# Altium footprint library Ixora.PcbLib: 191 footprints (part 4 of 12)
Each footprint in its own frame and in the unit in brackets; x right, y up, seen from the top. Pads: shape width x height; smd on the part's side, far side on the other; paste and mask are expansions set on the pad; w line width, h text height; cw(c..) or ccw(c..) is an arc to the next point about the centre after c.
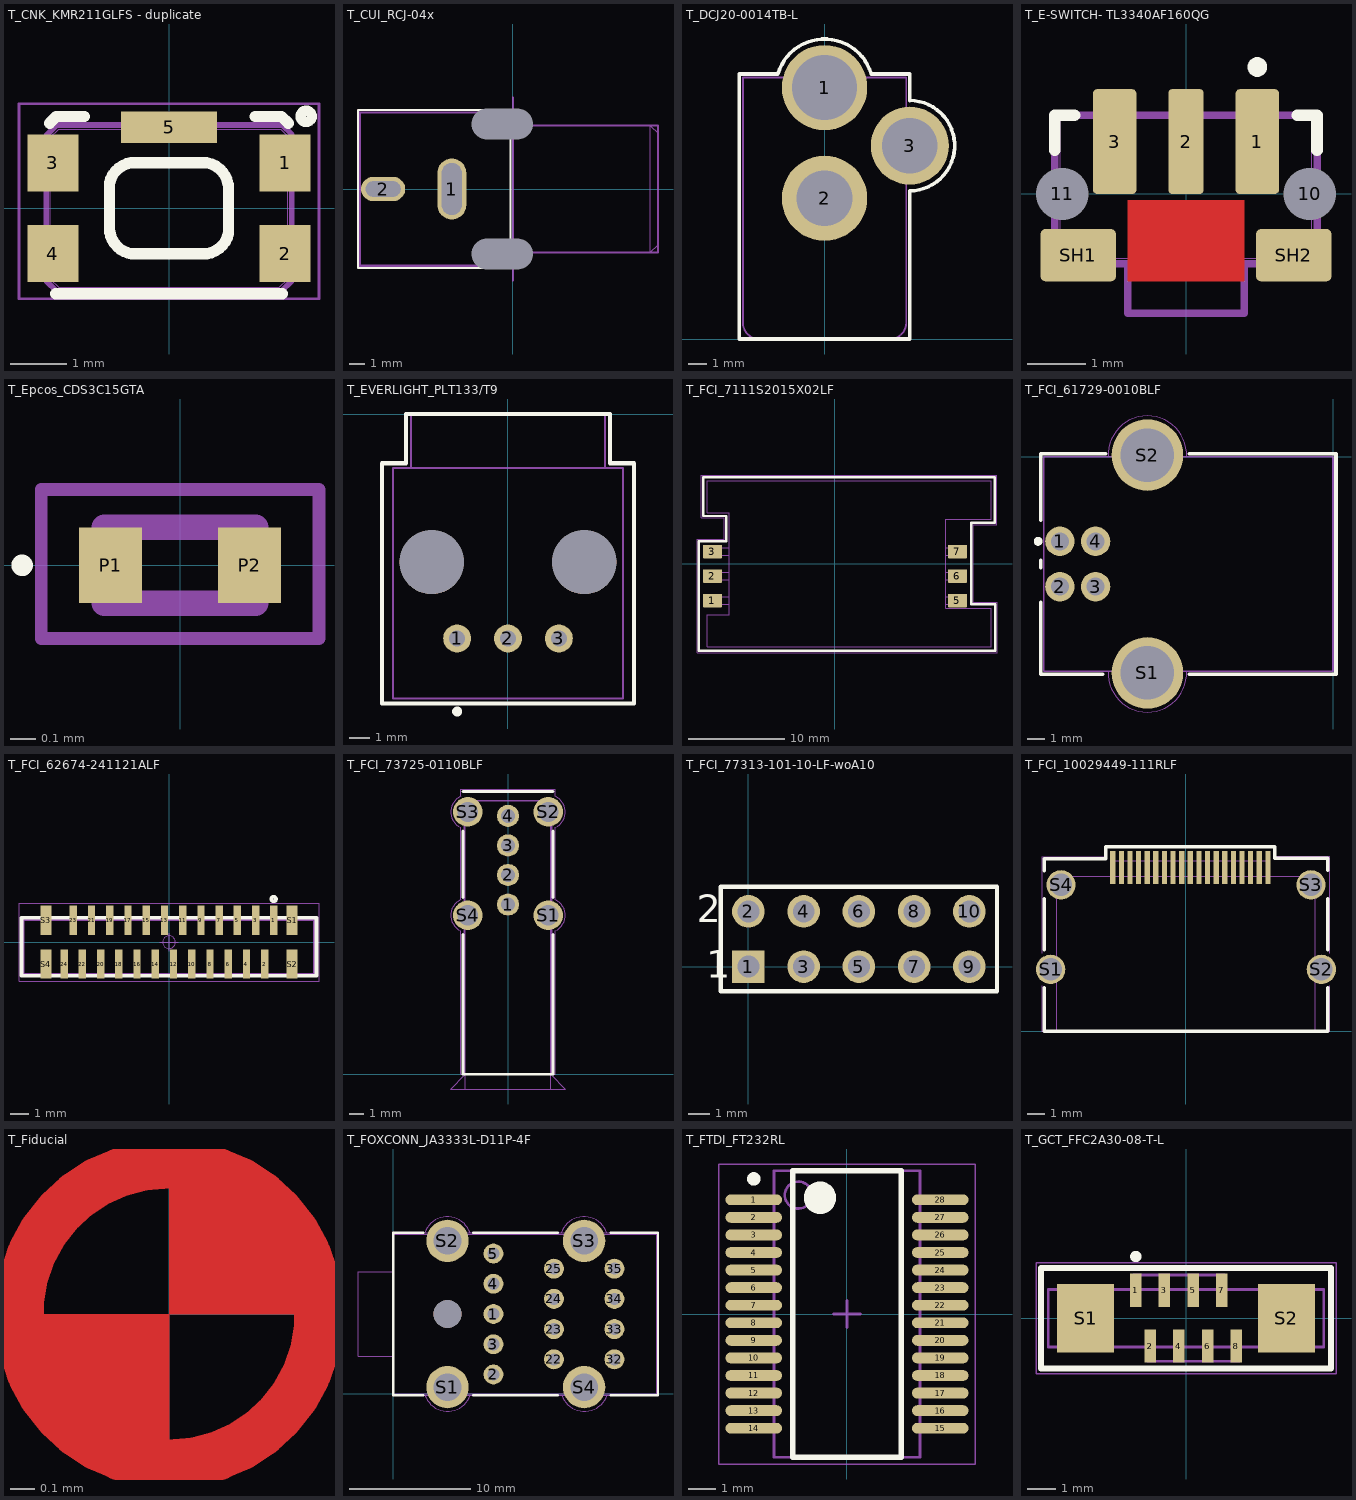
[diagram p3: the footprints below, top view; thin cyan lines are the x and y axes]

## T_CNK_KMR211GLFS - duplicate [mm] "Microminiature Tact Switch for SMT"
height 1.9
pads (5):
  rect 0.9x1 smd: 1(2.05,0.8) 2(2.05,-0.8) 3(-2.05,0.8) 4(-2.05,-0.8)
  rect 1.7x0.55 smd: 5(0,1.43)
Top Overlay:
  circle w0.18: c2.424,1.624 r0.1
  lines w0.2: -2.109,1.502 -1.991,1.62 -1.5,1.62 ; -2,-1.51 2,-1.51 ; -1.05,-0.36 -1.05,0.44 ; -1.05,-0.35 ccw(c-0.59,-0.35) -0.662,-0.804 ; -1.05,0.444 cw(c-0.6,0.35) -0.669,0.805 ; -0.66,0.805 0.66,0.805 ; -0.655,-0.805 0.65,-0.805 ; 0.669,-0.805 ccw(c0.6,-0.35) 1.05,-0.444 ; 0.684,0.8 cw(c0.59,0.35) 1.045,0.419 ; 1.05,-0.44 1.05,0.4 ; 1.52,1.621 1.989,1.621 2.108,1.502
Mechanical 1:
  lines w0.05: -2.65,-1.6 2.65,-1.6 2.65,1.845 -2.65,1.845 -2.65,-1.6
Mechanical 2:
  lines w0.001: -2.1,-1.25 -1.95,-1.4 1.95,-1.4 2.1,-1.25 2.1,1.27 1.97,1.4 -1.95,1.4 -2.1,1.25 -2.1,-1.25
Mechanical 3:
  lines w0.1: -2.17,-1.28 -1.98,-1.47 1.98,-1.47 2.17,-1.28 2.17,1.3 2,1.47 -1.98,1.47 -2.17,1.28 -2.17,-1.28
3D body: height 2.12, standoff 0.02, extent -2.299,-1.509 2.301,1.491

## T_CUI_RCJ-04x [mm] "Right Angle RCA Connector THT"
height 12.6
pads (4):
  oval 1.9x4 hole 1.3 slot 3.4 at 90 deg: 1(-4,0)
  oval 2.9x1.6 hole 1 slot 2.3 at 0 deg: 2(-8.5,0)
  round 0 hole 2 slot 4 at 0 deg: Hole1(-0.7,4.25) Hole2(-0.7,-4.25)
Top Overlay:
  lines w0.127: -0.147,5.165 -10.143,5.165 -10.143,-5.165 -0.146,-5.165 -0.146,5.144
Mechanical 1:
  lines w0.127: -10.123,-5.152 -10.123,5.185 0,5.185 0,-5.152 -10.123,-5.152
Mechanical 2:
  lines w0: 0,-5 0,5
  lines w0.001: 0,-5 -10,-5 -10,5 0,5 ; 0,-4.15 9,-4.15 ; 0,4.15 9,4.15 ; 9,-4.15 9,4.15 ; 9,-4.15 9.5,-3.65 9.5,3.65 9,4.15
Mechanical 3:
  lines w0.127: 0,-6 0,6 ; 0,-4.15 9.5,-4.15 9.5,4.15 0,4.15 ; -10,-5 -10,5 0,5 0,-5 -10,-5

## T_DCJ20-0014TB-L [mm] "Header, 1x2 Pins, 2.54 mm pitch, male"
height 10.7
pads (3):
  round 4.7 hole 3.58: 1(0,13.85)
  round 4.7 hole 3.07: 2(0,7.75)
  round 4.3 hole 3.07: 3(4.7,10.65)
Top Overlay:
  lines w0.2: -2.569,14.598 cw(c0,13.85) 2.569,14.6 4.7,14.6 4.7,13.142 cw(c4.675,10.65) 4.7,8.158 ; -2.569,14.6 -4.7,14.6 -4.7,0 4.675,0 ; 4.7,0 4.7,8.157
Mechanical 1:
  lines w0.05: 4.675,0 -4.7,0 -4.7,14.6 -2.568,14.6 cw(c0,13.85) 2.568,14.6 4.7,14.6 4.7,13.125 cw(c4.7,10.65) 4.7,8.175 4.7,0
Mechanical 2:
  lines w0.001: -1.4,13.95 -1.4,14.4 -4.5,14.4 -4.5,0.9 ccw(c-3.6,0.9) -3.6,0 3.6,0 ; 1.4,13.95 1.4,14.4 4.5,14.4 4.5,0.9 cw(c3.6,0.9) 3.6,0
Mechanical 3:
  lines w0.1: -4.5,0.9 ccw(c-3.6,0.9) -3.6,0 3.6,0 ccw(c3.6,0.9) 4.5,0.9 4.5,14.4 -4.5,14.4 -4.5,0.9
3D body: height 10.7, standoff 0, extent -4.5,0 4.5,14.4
3D body: height 4, standoff -3.7, extent 4.5,9.45 4.7,11.85
3D body: height 4, standoff -3.7, extent -1.2,7.65 1.2,7.85
3D body: height 4, standoff -3.7, extent -1.4,13.75 1.4,13.95
3D body: height 9.59, standoff 3.21, extent -3.2,0 3.175,2
3D body: height 7.4, standoff 5.4, extent -1,0 0.992,2

## T_E-SWITCH- TL3340AF160QG [mm] "SWITCH TACT SUB MINI 160GF SMD"
height 3.3
pads (7):
  rrect20% 0.75x1.8 smd: 1(1.225,0.9) 3(-1.225,0.9)
  rrect20% 0.6x1.8 smd: 2(0,0.9)
  round 0.5 hole 0.9: 10(2.125,0) 11(-2.125,0)
  rrect20% 1.3x0.9 smd: SH1(-1.85,-1.05) SH2(1.85,-1.05)
Top Layer:
  pour cut-out: -1,-0.103 -1,-1.5 1,-1.5 1,-0.103
Top Overlay:
  circle w0.254: c1.225,2.18 r0.041
  lines w0.2: -2.255,0.75 -2.255,1.35 -1.915,1.35 ; 1.91,1.35 2.25,1.35 2.25,0.75
Mechanical 2:
  lines w0.001: -2.25,-1.105 2.25,-1.105 ; -2.155,-1.2 -2.155,1.35 ; -1,-1.2 -1,-2.05 1,-2.05 1,-1.2 ; 2,-1.2 2.25,-1.2 ; 2.155,-0.42 2.25,-0.42 ; 2.155,0.42 2.25,0.42 ; 2.155,1.35 2.155,-1.2 2.25,-1.2 ; -2.25,-1.2 -2,-1.2 -2.25,-1.2 ; -2.25,-1.2 -2.25,1.35 2.25,1.35 2.25,-1.2 ; -2.25,-1.2 2.25,-1.2
Mechanical 3:
  lines w0.127: -1,-1.2 -1,-2.05 1,-2.05 1,-1.2 ; -2.25,-1.2 -2.25,1.35 2.25,1.35 2.25,-1.2 -2.25,-1.2
3D body: height 3, standoff 2.4, extent 1.402,-1.4 2,-1.2
3D body: height 3, standoff 2.4, extent -2,-1.4 -1.402,-1.2
3D body: height 2.7, standoff 0.7, extent -0.996,-2.051 0.996,-1.2
3D body: height 3.3, standoff 0, extent -2.155,-1.105 2.155,1.35
3D body: height 3.3, standoff 0, extent -2.25,-1.2 2.25,-1.105
3D body: height 3.3, standoff 0, extent -2.25,-1.105 -2.155,1.35
3D body: height 3.3, standoff 0, extent 2.155,-1.105 2.25,1.35
3D body: height 0, standoff -0.45, extent 2.155,-0.42 2.25,0.42
3D body: height 0, standoff -0.45, extent -2.25,-0.42 -2.155,0.42

## T_Epcos_CDS3C15GTA [mm] "Bidirectional ESD Protection"
height 0.27
pads (2):
  rect 0.25x0.3 smd: P1(-0.275,0) P2(0.275,0)
Top Overlay:
  circle w0.06: c-0.625,0 r0.012
Mechanical 1:
  lines w0.05: -0.55,-0.29 0.55,-0.29 0.55,0.3 -0.55,0.3 -0.55,-0.29
Mechanical 2:
  lines w0.001: -0.315,-0.165 0.315,-0.165 0.315,0.165 -0.315,0.165 -0.315,-0.165
Mechanical 3:
  lines w0.1: -0.3,-0.15 0.3,-0.15 0.3,0.15 -0.3,0.15 -0.3,-0.15
3D body: height 0.27, standoff 0, extent -0.315,-0.165 0.315,0.165

## T_EVERLIGHT_PLT133/T9 [mm] "USB Type B Connectors"
height 20
pads (5):
  round 1.4 hole 0.8: 1(-2.54,-11.21) 2(0,-11.21) 3(2.54,-11.21)
  round 3.2 hole 3.2 unplated: ""(-3.81,-7.4) ""(3.81,-7.4)
Top Overlay:
  circle w0.25: c-2.54,-14.86 r0.125
  lines w0.2: -6.3,-14.46 6.3,-14.46 6.3,-2.46 5.1,-2.46 5.1,0 -5.1,0 -5.1,-2.46 -6.3,-2.46 -6.3,-14.46
Mechanical 1:
  lines w0.05: -6.3,-14.46 -6.3,-2.46 -5.1,-2.46 -5.1,0 5.1,0 5.1,-2.46 6.3,-2.46 6.3,-14.46 -6.3,-14.46
Mechanical 2:
  lines w0.01: -4.85,-2.7 -4.85,0 4.85,0 4.85,-2.7 ; -5.75,-14.21 5.75,-14.21 5.75,-2.7 -5.75,-2.7 -5.75,-14.21
Mechanical 3:
  lines w0.1: -4.85,-2.7 -4.85,0 4.85,0 4.85,-2.7 ; -5.75,-14.21 5.75,-14.21 5.75,-2.7 -5.75,-2.7 -5.75,-14.21

## T_FCI_7111S2015X02LF [mm] "6 Contacts Sim Card Holder"
height 2.5
pads (6):
  rrect12% 2x1.4 smd: 1(-12.7,-3.81) 2(-12.7,-1.27) 3(-12.7,1.27) 5(12.7,-3.81) 6(12.7,-1.27) 7(12.7,1.27)
Top Overlay:
  lines w0.254: -14.1,-9 16.6,-9 16.6,-4.2 14.15,-4.2 14.15,4.25 16.55,4.25 16.55,8.95 -13.65,8.95 -13.65,4.95 -11.25,4.95 -11.25,2.35 -14.1,2.35 -14.1,-9
Mechanical 1:
  lines w0.05: -14.3,-9.2 -14.3,2.55 -11.45,2.55 -11.45,4.75 -13.85,4.75 -13.85,9.15 16.75,9.15 16.75,4.05 14.35,4.05 14.35,-4 16.8,-4 16.8,-9.2 -14.3,-9.2
Mechanical 2:
  lines w0.01: -10.95,-4.21 -13.25,-4.21 -13.25,-3.41 -10.95,-3.41 ; -10.95,-1.67 -13.25,-1.67 -13.25,-0.87 -10.95,-0.87 ; -10.95,0.87 -13.25,0.87 -13.25,1.67 -10.95,1.67 ; 11.49,-4.21 13.25,-4.21 13.25,-3.41 11.49,-3.41 ; 11.49,-1.67 13.25,-1.67 13.25,-0.87 11.49,-0.87 ; 11.49,0.87 13.25,0.87 13.25,1.67 11.49,1.67 ; -13.25,-8.6 16.19,-8.6 16.19,-4.6 11.49,-4.6 11.49,4.6 16.19,4.6 16.19,8.6 -13.25,8.6 -13.25,5.3 -10.95,5.3 -10.95,-5.3 -13.25,-5.3 -13.25,-8.6
Mechanical 3:
  lines w0.1: -13.25,-8.6 -13.25,-5.3 -10.95,-5.3 -10.95,5.3 -13.25,5.3 -13.25,8.6 16.19,8.6 16.19,4.6 11.49,4.6 11.49,-4.6 16.19,-4.6 16.19,-8.6 -13.25,-8.6

## T_FCI_61729-0010BLF [mm] "USB Type B Connectors"
height 10.6
pads (6):
  round 1.65 hole 1: 1(-15.3,-4.73) 2(-15.3,-7.27) 3(-13.3,-7.27) 4(-13.3,-4.73)
  round 4 hole 3: S1(-10.4,-12.1) S2(-10.4,0.1)
Top Overlay:
  circle w0.25: c-16.512,-4.73 r0.125
  lines w0.2: -16.362,-8.14 -16.362,-12.163 -12.89,-12.163 ; -16.362,-6.21 -16.362,-5.8 ; -16.362,-3.55 -16.362,0.162 -12.737,0.162 ; -8.062,-12.163 0.163,-12.163 0.163,0.162 -8.062,0.162
Mechanical 1:
  lines w0.05: -16.2,-12 -16.2,0 -12.598,0 cw(c-10.4,0.096) -8.202,0 -0.003,0 0,-0.003 0,-12 -8.202,-12 cw(c-10.4,-12.096) -12.598,-12 -16.2,-12
Mechanical 2:
  lines w0.001: -16.2,-12 -16.2,0 0,0 0,-12 -16.2,-12
Mechanical 3:
  lines w0.1: -16.2,-12 -16.2,0 0,0 0,-12 -16.2,-12
3D body: height 11.02, standoff -3.7, extent -16.61,-13.43 -0.31,1.469

## T_FCI_62674-241121ALF [mm] "DVI FFC Connector 0.5mm pitch"
height 4.1
pads (28):
  rect 0.4x1.6 smd: 1(5.75,1.2) 2(5.25,-1.2) 3(4.75,1.2) 4(4.25,-1.2) 5(3.75,1.2) 6(3.25,-1.2) 7(2.75,1.2) 8(2.25,-1.2) 9(1.75,1.2) 10(1.25,-1.2) 11(0.75,1.2) 12(0.25,-1.2) 13(-0.25,1.2) 14(-0.75,-1.2) 15(-1.25,1.2) 16(-1.75,-1.2) 17(-2.25,1.2) 18(-2.75,-1.2) 19(-3.25,1.2) 20(-3.75,-1.2) 21(-4.25,1.2) 22(-4.75,-1.2) 23(-5.25,1.2) 24(-5.75,-1.2)
  rect 0.6x1.6 smd: S1(6.75,1.2) S2(6.75,-1.199) S3(-6.75,1.2) S4(-6.75,-1.2)
Top Overlay:
  circle w0.2: c5.742,2.367 r0.125
  lines w0.2: -8.089,-1.836 8.086,-1.836 8.086,1.342 -8.086,1.342 -8.086,-1.831
Mechanical 1:
  circle w0.05: c0,0 r0.35
  lines w0.05: -0.5,0 0.5,0 ; 0,-0.5 0,0.5 ; -8.226,-2.141 -8.226,2.141 8.226,2.141 8.226,-2.141 -8.226,-2.141
Mechanical 2:
  lines w0.001: -7.95,-1.7 -7.95,1.2 7.95,1.2 7.95,-1.7 -7.95,-1.7
Mechanical 3:
  lines w0.1: -8.011,-1.761 -8.011,1.276 8.011,1.276 8.011,-1.761 -8.011,-1.761

## T_FCI_73725-0110BLF [mm] "USB Type A Connector Vertical"
height 13.83
pads (8):
  round 1.5 hole 0.95: 1(0,11.49) 2(0,13.49) 3(0,15.49) 4(0,17.49)
  round 2 hole 1.37: S1(2.72,10.76) S2(2.72,17.76) S3(-2.72,17.76) S4(-2.72,10.76)
Top Overlay:
  lines w0.2: -3.046,9.463 -3.046,0 3.046,0 3.046,9.463 ; -3.046,11.964 -3.046,16.474 ; -3.046,19.15 3.046,19.15 ; 3.042,11.964 3.042,16.474
Mechanical 1:
  lines w0.05: -3.201,9.708 cw(c-2.72,10.76) -3.202,11.812 ; -3.202,9.709 -3.202,0 3.201,0 3.201,9.707 ; -3.201,16.708 cw(c-2.72,17.76) -3.202,18.812 -3.202,19.31 3.202,19.31 3.202,18.814 ; -3.201,11.813 -3.201,16.708 ; 3.201,11.812 3.201,16.707 ; 3.202,9.708 ccw(c2.72,10.76) 3.201,11.812 ; 3.202,16.708 ccw(c2.72,17.76) 3.201,18.812
Mechanical 2:
  lines w0.01: -2.88,-1 -2.88,18.498 2.88,18.498 2.88,-1 ; -3.88,-1 3.88,-1 2.88,0 -2.88,0 -3.88,-1
Mechanical 3:
  lines w0.1: -2.945,0 2.946,0 2.946,18.498 -2.945,18.498 -2.945,0
3D body: height 14.57, standoff -3.59, extent -3.545,-0.758 3.575,18.498

## T_FCI_77313-101-10-LF-woA10 [mm] "2.54 mm header"
height 10.8
pads (10):
  rect 1.5x1.5 hole 1: 1(0,0)
  round 1.5 hole 1: 2(0,2.54) 3(2.54,0) 4(2.54,2.54) 5(5.08,0) 6(5.08,2.54) 7(7.62,0) 8(7.62,2.54) 9(10.16,0) 10(10.16,2.54)
Top Overlay:
  lines w0.2: -1.27,-1.14 11.43,-1.14 ; -1.27,-1.137 -1.27,3.68 11.43,3.68 11.43,-1.137
  text "1" at -1.941,-0.522 h1.27
  text "2" at -2.364,2.048 h1.27
Mechanical 1:
  lines w0.05: -1.27,-1.14 11.43,-1.14 ; -1.27,-1.137 -1.27,3.68 11.43,3.68 11.43,-1.137
Mechanical 2:
  lines w0.001: -1.27,-1.14 -1.27,3.68 11.43,3.68 11.43,-1.14 -1.27,-1.14
Mechanical 3:
  lines w0.1: -1.27,-1.14 11.43,-1.14 ; -1.27,-1.137 -1.27,3.68 11.43,3.68 11.43,-1.137
3D body: height 8.39, standoff -2.41, extent -1.07,-1.145 11.23,3.685

## T_FCI_10029449-111RLF [mm] "CON RECPT HDMI THT R/A W/O FLNG"
height 6.1
pads (23):
  rect 0.3x1.9 smd: 1(4.75,9.5) 2(4.25,9.5) 3(3.75,9.5) 4(3.25,9.5) 5(2.75,9.5) 6(2.25,9.5) 7(1.75,9.5) 8(1.25,9.5) 9(0.75,9.5) 10(0.25,9.5) 11(-0.25,9.5) 12(-0.75,9.5) 13(-1.25,9.5) 14(-1.75,9.5) 15(-2.25,9.5) 16(-2.75,9.5) 17(-3.25,9.5) 18(-3.75,9.5) 19(-4.25,9.5)
  round 1.7 hole 1.3: S1(-7.85,3.6) S2(7.85,3.6) S3(7.25,8.5) S4(-7.25,8.5)
Top Overlay:
  lines w0.2: -8.225,2.525 -8.225,0 8.225,0 8.225,2.525 ; -8.225,4.745 -8.225,7.7 ; -8.225,9.315 -8.225,10.025 -4.65,10.025 -4.65,10.72 5.15,10.72 5.15,10.055 8.225,10.055 8.225,9.345 ; 8.225,4.745 8.225,7.7
Mechanical 1:
  lines w0.05: -8.325,2.66 -8.325,0 8.325,0 8.325,2.66 ; -8.325,4.525 -8.325,10.125 -4.65,10.125 -4.65,10.695 5.15,10.695 5.15,10.15 8.325,10.15 8.325,4.525
Mechanical 2:
  lines w0.01: -7.5,0 -7.5,9 ; -7.5,0 7.5,0 ; -7.5,0 -7.5,9 ; -7.5,0 7.5,0 ; -7.5,9 7.5,9 ; -7.5,9 7.5,9 ; -4.35,9.9 4.85,9.9 ; -4.35,9.9 -4.35,9 -4.35,9.9 ; -4.35,9.9 4.85,9.9 ; 4.85,9.9 4.85,9 4.85,9.9 ; 7.5,0 7.5,9 ; 7.5,0 7.5,9
3D body: height 6.17, standoff -1.83, extent -8.1,0 8.1,9.85

## T_Fiducial [mm] "Fiducial"
Top Layer:
  region: 0.625,0 0,0 0,0.625 0.375,0.5 0.625,0.25
  region: 0,-0.625 -0.375,-0.5 -0.625,-0.25 -0.625,0 0,0
  lines w0.203: 0,-0.625 cw(c0,0) 0,0.625 cw(c0,0) 0,-0.625
Top Solder:
  circle w0.203: c0,0 r0.625
  region: 0.625,0 0.5,-0.375 0.25,-0.625 -0.25,-0.625 -0.5,-0.375 -0.625,0 -0.5,0.375 -0.375,0.5 0,0.625 0.375,0.5 0.5,0.25 0.5,0.375 0.375,0.5

## T_FOXCONN_JA3333L-D11P-4F [mm] "Audio Jack Triple Stacked DIP Type With Sense"
height 35.5
pads (18):
  round 1.65 hole 1: 1(8.3,6.6) 2(8.3,1.6) 3(8.3,4.1) 4(8.3,9.1) 5(8.3,11.6) 22(13.3,2.85) 23(13.3,5.35) 24(13.3,7.85) 25(13.3,10.35) 32(18.3,2.85) 33(18.3,5.35) 34(18.3,7.85) 35(18.3,10.35)
  round 3.5 hole 2.3: S1(4.5,0.55) S2(4.5,12.65) S3(15.8,12.65) S4(15.8,0.55)
  round 2.3 hole 2.3 unplated: ""(4.5,6.6)
Top Overlay:
  lines w0.2: 0,-0.105 2.5,-0.105 ; 0,-0.082 0,13.305 2.5,13.305 ; 6.625,-0.105 13.625,-0.105 ; 6.625,13.305 13.625,13.305 ; 18,-0.105 21.903,-0.105 21.905,-0.105 21.905,13.305 18,13.305
Mechanical 1:
  lines w0.05: 2.604,13.299 cw(c4.484,12.666) 6.363,13.301 ; 2.604,13.3 0,13.3 0,-0.1 2.637,-0.1 ; 2.637,-0.101 ccw(c4.516,0.533) 6.396,-0.099 ; 6.363,13.3 13.904,13.3 ; 6.396,-0.1 13.937,-0.1 ; 13.904,13.299 cw(c15.784,12.666) 17.663,13.301 ; 13.937,-0.101 ccw(c15.816,0.533) 17.696,-0.099 ; 17.663,13.3 21.9,13.3 21.9,-0.1 17.696,-0.1
Mechanical 2:
  lines w0.001: 0,3.1 -2.9,3.1 -2.9,10.1 0,10.1 ; 0,0 21.8,0 21.8,13.2 0,13.2 0,0
Mechanical 3:
  lines w0.1: 0,-0.1 21.901,-0.1 ; 0,13.3 21.9,13.3 21.902,13.298 21.902,-0.1 ; 0.001,-0.074 0.001,13.326 ; 21.901,-0.1 21.902,-0.1
3D body: height 38.5, standoff 0, extent 0,0 21.8,13.2
3D body: height 8.51, standoff 1.49, extent -2.9,3.1 0,10.1
3D body: height 33.51, standoff 26.49, extent -2.9,3.1 0,10.1
3D body: height 21.01, standoff 13.99, extent -2.9,3.1 0,10.1
3D body: height 6.5, standoff 3.5, extent -2.905,5.105 0.01,8.093
3D body: height 19, standoff 16, extent -2.905,5.105 0.01,8.093
3D body: height 31.5, standoff 28.5, extent -2.905,5.105 0.01,8.093

## T_FTDI_FT232RL [mm] "28-Pin SSOP 0.65 mm Pitch"
height 2
pads (28):
  oval 2.1x0.4 smd: 1(-3.45,4.225) 2(-3.45,3.575) 3(-3.45,2.925) 4(-3.45,2.275) 5(-3.45,1.625) 6(-3.45,0.975) 7(-3.45,0.325) 8(-3.45,-0.325) 9(-3.45,-0.975) 10(-3.45,-1.625) 11(-3.45,-2.275) 12(-3.45,-2.925) 13(-3.45,-3.575) 14(-3.45,-4.225) 15(3.45,-4.225) 16(3.45,-3.575) 17(3.45,-2.925) 18(3.45,-2.275) 19(3.45,-1.625) 20(3.45,-0.975) 21(3.45,-0.325) 22(3.45,0.325) 23(3.45,0.975) 24(3.45,1.625) 25(3.45,2.275) 26(3.45,2.925) 27(3.45,3.575) 28(3.45,4.225)
Top Overlay:
  circle w0.25: c-3.45,5 r0.125
  circle w0.6: c-1,4.3 r0.3
  lines w0.2: -2,-5.3 -2,5.3 2,5.3 2,-5.3 -2,-5.3
Mechanical 1:
  lines w0.05: -4.75,-5.55 4.75,-5.55 4.75,5.55 -4.75,5.55 -4.75,-5.55
  lines w0.1: -0.5,0 0.5,0 ; 0,-0.5 0,0.5
Mechanical 2:
  lines w0.001: -2.7,-5.3 -2.7,5.3 2.7,5.3 2.7,-5.3 -2.7,-5.3
Mechanical 3:
  circle w0.1: c-1.8,4.4 r0.5
  lines w0.1: -2.7,-5.3 2.7,-5.3 2.7,5.3 -2.7,5.3 -2.7,-5.3
3D body: height 2, standoff 0, extent -2.7,-5.3 2.7,5.3

## T_GCT_FFC2A30-08-T-L [mm] "JTAG FFC Connector 0.5mm pitch vertical"
height 5.4
pads (10):
  rect 0.4x1.15 smd: 1(-1.75,0.975) 2(-1.25,-0.975) 3(-0.75,0.975) 4(-0.25,-0.975) 5(0.25,0.975) 6(0.75,-0.975) 7(1.25,0.975) 8(1.75,-0.975)
  rect 2x2.4 smd: S1(-3.5,0) S2(3.5,0)
Top Overlay:
  circle w0.254: c-1.75,2.15 r0.071
  lines w0.2: -5.05,-1.75 -5.05,1.75 5.05,1.75 5.05,-1.75 -5.05,-1.75
Mechanical 1:
  lines w0.05: -5.225,-1.925 -5.225,1.925 5.225,1.925 5.225,-1.925 -5.225,-1.925
Mechanical 2:
  lines w0.001: -4.25,-1 -4.25,1 ; -1.85,1 -1.85,1.5 1.35,1.5 1.35,1 ; -1.35,-1 -1.35,-1.5 1.85,-1.5 1.85,-1 ; 4.25,-1 4.25,1 ; -4.8,-1 -4.8,1 4.8,1 4.8,-1 -4.8,-1
Mechanical 3:
  lines w0.1: -1.85,1 -1.85,1.5 1.35,1.5 1.35,1 ; -1.35,-1 -1.35,-1.5 1.85,-1.5 1.85,-1 ; -4.8,-1 4.8,-1 4.8,1 -4.8,1 -4.8,-1
3D body: height 4.4, standoff 2.5, extent -4.8,-1 4.8,1
3D body: height 2.5, standoff 0, extent -4.25,-1 4.25,1